# Altium footprint library chipfc_extras_footprint.PCBLIB: 89 footprints (part 2 of 6)
Each footprint in its own frame and in the unit in brackets; x right, y up, seen from the top. Pads: shape width x height; smd on the part's side, far side on the other; paste and mask are expansions set on the pad; w line width, h text height; cw(c..) or ccw(c..) is an arc to the next point about the centre after c.
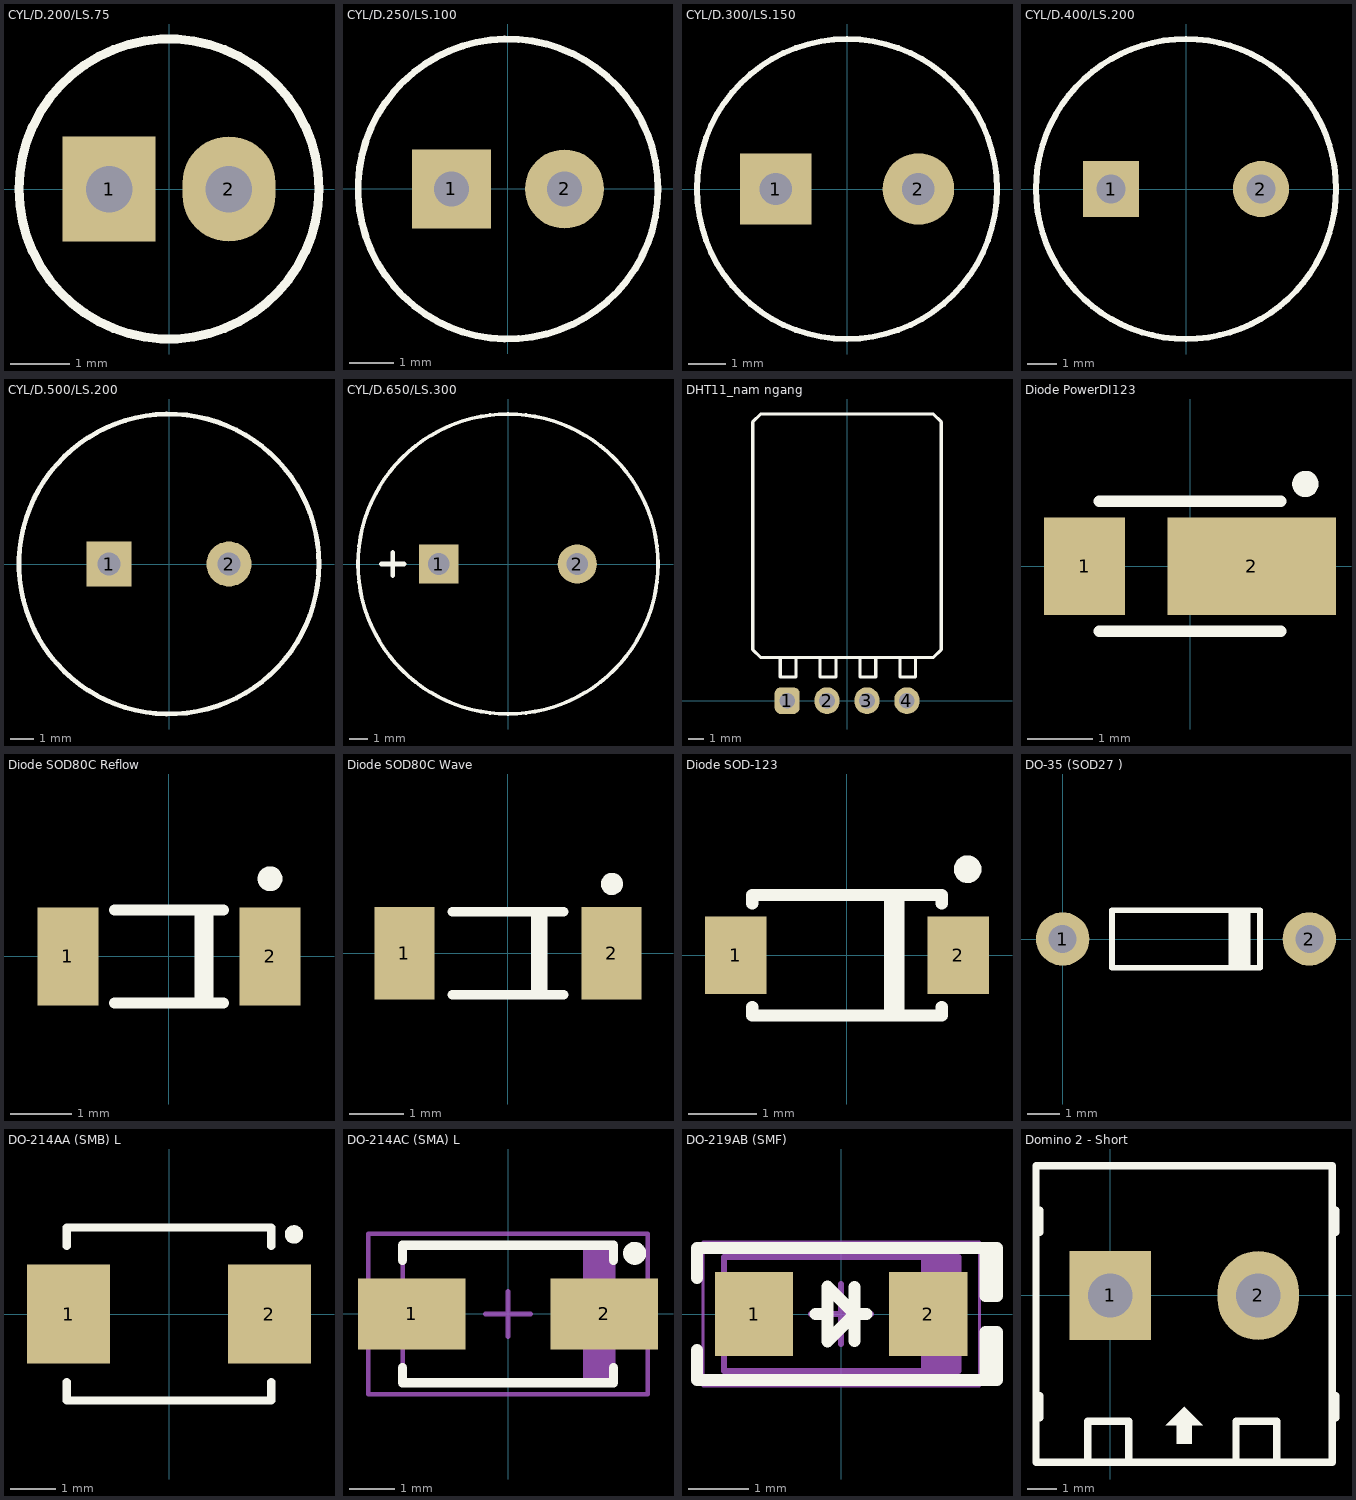
[diagram p1: the footprints below, top view; thin cyan lines are the x and y axes]

## CYL/D.200/LS.75 [mil]
pads (2):
  rect 62x70 hole 31: 1(-40,0)
  oval 62x70 hole 31: 2(40,0)
Top Overlay:
  circle w6: c0,0 r100
3D body "CircuitWorks-ELECTROLITIC CAPACITOR RADIAL 5X11.step": height 433.07, standoff -98.43, extent -98.42,-98.42 98.43,98.43

## CYL/D.250/LS.100 [mil]
pads (2):
  rect 70x70 hole 31: 1(-50,0)
  round 70 hole 31: 2(50,0)
Top Overlay:
  circle w6: c0,0 r132.72
3D body "User Library-CapAluRadial_D63H110.STEP": height 492.13, standoff -118.11, extent -133.86,-133.45 132.72,133.45

## CYL/D.300/LS.150 [mil]
pads (2):
  rect 75x75 hole 34: 1(-75,0)
  round 75 hole 34: 2(75,0)
Top Overlay:
  circle w6: c0,0 r157.49
3D body "CircuitWorks-ELECTROLITIC CAPACITOR RADIAL 8X12.step": height 472.44, standoff -98.43, extent -157.48,-157.48 157.49,157.49

## CYL/D.400/LS.200 [mil]
pads (2):
  rect 75x75 hole 39: 1(-100,0)
  round 75 hole 39: 2(100,0)
Top Overlay:
  lines w8: -200,0 ccw(c0,0) 0,-200 ccw(c0,0) 200,0 ccw(c0,0) 0,200 ccw(c0,0) -200,0
3D body "User Library-CE_R200_D400_H500.step": height 500, standoff -106.3, extent -198.38,-199.3 200,199.32

## CYL/D.500/LS.200 [mil]
pads (2):
  rect 75x75 hole 39: 1(-100,0)
  round 75 hole 39: 2(100,0)
Top Overlay:
  circle w8: c0,0 r250
3D body "User Library-CapAluRadial_D125H200.STEP": height 866.14, standoff -118.11, extent -255.9,-255.12 253.72,255.12

## CYL/D.650/LS.300 [mil]
pads (2):
  rect 85x85 hole 47.24: 1(-150,0)
  round 85 hole 47.24: 2(150,0)
Top Overlay:
  circle w8: c0,0 r325
  lines w10: -275,0 -225,0 ; -250,-25 -250,25
3D body "User Library-CE_R300_D650_H1000.step": height 1000, standoff -137.8, extent -324.13,-324.03 324.8,324.04

## DHT11_nam ngang [mm] "Cam bien do am va nhiet do"
height 5.5
pads (4):
  rrect50% 1.6x1.7 hole 1: 1(-3.81,0)
  oval 1.6x1.7 hole 1: 2(-1.27,0) 3(1.27,0) 4(3.81,0)
Top Overlay:
  lines w0.2: -4.25,2.75 -4.25,1.5 -3.25,1.5 -3.25,2.75 ; -1.71,2.75 -1.71,1.5 -0.71,1.5 -0.71,2.75 ; 0.83,2.75 0.83,1.5 1.83,1.5 1.83,2.75 ; 3.37,2.75 3.37,1.5 4.37,1.5 4.37,2.75 ; -6,3.25 -5.5,2.75 5.5,2.75 6,3.25 6,17.75 5.5,18.25 -5.5,18.25 -6,17.75 -6,3.25
3D body "User Library-DHT11-right.step": height 5.5, standoff -2.6, extent -6,-0.4 6,18.1

## Diode PowerDI123 [mm]
pads (2):
  rect 1.25x1.5 smd: 1(-1.625,0)
  rect 2.6x1.5 smd: 2(0.95,0)
Top Overlay:
  circle w0.203: c1.778,1.27 r0.102
  lines w0.178: -1.397,-1 1.397,-1 ; -1.397,1 1.397,1
3D body "User Library-POWERDI-123.STEP": height 1, standoff 0, extent -1.95,-0.965 1.95,0.965

## Diode SOD80C Reflow [mm]
pads (2):
  rect 1x1.6 smd: 1(-1.65,0) 2(1.65,0)
Top Overlay:
  circle w0.203: c1.651,1.27 r0.102
  lines w0.178: -0.889,-0.762 0.889,-0.762 ; -0.889,0.762 0.889,0.762 ; 0.508,-0.762 0.508,0.762 ; 0.635,-0.762 0.635,0.762
3D body "User Library-sod80-1-mini-melf-LL4148.step": height 1.44, standoff -0.01, extent -1.75,-0.725 1.75,0.725

## Diode SOD80C Wave [mm]
pads (2):
  rect 1.1x1.7 smd: 1(-1.9,0) 2(1.9,0)
Top Overlay:
  circle w0.203: c1.905,1.27 r0.102
  lines w0.178: -1.016,-0.762 1.016,-0.762 ; -1.016,0.762 1.016,0.762 ; 0.508,-0.762 0.508,0.762 ; 0.635,-0.762 0.635,0.762
3D body "User Library-sod80-1-mini-melf-LL4148.step": height 1.44, standoff -0.01, extent -1.75,-0.725 1.75,0.725

## Diode SOD-123 [mm]
pads (2):
  rect 0.91x1.143 smd: 1(-1.64,0) 2(1.64,0)
Top Overlay:
  circle w0.203: c1.778,1.27 r0.102
  lines w0.178: -1.397,-0.762 -1.397,-0.889 1.397,-0.889 1.397,-0.762 ; -1.397,0.762 -1.397,0.889 1.397,0.889 1.397,0.762 ; 0.635,-0.889 0.635,0.889 ; 0.762,-0.889 0.762,0.889
3D body "User Library-SOD-123 CASE 425-04.STEP": height 1.2, standoff 0, extent -1.65,-0.8 1.65,0.8

## DO-35 (SOD27 ) [mil]
pads (2):
  round 65 hole 34: 1(0,0) 2(300,0)
Top Overlay:
  lines w7: 205,-35 205,35 ; 210,-35 210,35 ; 215,-35 215,35 ; 220,-35 220,35 ; 225,-35 225,35 ; 60,-35 240,-35 240,35 60,35 60,-35
3D body "User Library-DO-35.step": height 77.8, standoff -95.83, extent -11.02,-37.79 311.02,37.8

## DO-214AA (SMB) L [mm]
pads (2):
  rect 1.82x2.18 smd: 1(-2.21,0) 2(2.21,0)
Top Overlay:
  circle w0.203: c2.75,1.75 r0.102
  lines w0.178: -2.25,-1.5 -2.25,-1.9 2.25,-1.9 2.25,-1.5 ; -2.25,1.5 -2.25,1.9 2.25,1.9 2.25,1.5
3D body "User Library-DIOM5539X24.step": height 2.45, standoff 0.03, extent -2.75,-1.95 2.75,1.95

## DO-214AC (SMA) L [mm] "Molded Diode, 2-Leads, Body 4.3x2.7mm, IPC Medium Density"
height 2.5
pads (2):
  rect 2.35x1.55 smd: 1(-2.1,0) 2(2.1,0)
Top Overlay:
  circle w0.25: c2.765,1.325 r0.125
  lines w0.2: -2.3,-1.175 -2.3,-1.5 2.3,-1.5 2.3,-1.175 ; -2.3,1.175 -2.3,1.5 2.3,1.5 2.3,1.175
Mechanical 13:
  rectangle: 1.637,-1.45 2.256,1.45
  lines w0.1: -2.3,-1.45 -2.3,1.45 2.3,1.45 2.3,-1.45 -2.3,-1.45
Mechanical 15:
  lines w0.1: -0.5,0 0.5,0 ; 0,-0.5 0,0.5 ; -3.05,-1.75 -3.05,1.75 3.05,1.75 3.05,-1.75 -3.05,-1.75
3D body "User Library-DO-214AC SMA.step": height 2.4, standoff 0, extent -2.6,-1.295 2.6,1.305

## DO-219AB (SMF) [mm] "Molded Diode, 2-Leads, Body 3.90x1.90mm, IPC Medium Density"
height 1.1
pads (2):
  rect 1.3x1.4 smd: 1(-1.45,0) 2(1.45,0)
Top Overlay:
  lines w0.2: -2.4,-0.6 -2.4,-1.1 2.594,-1.1 2.594,-0.3 2.4,-0.3 2.4,-1.1 ; -2.4,0.6 -2.4,1.1 2.594,1.1 2.594,0.3 2.4,0.3 2.4,1.1 ; -0.429,-0.004 -0.229,-0.004 ; 0.225,-0.45 0.225,0.45 ; 0.425,0 0.225,0 ; 0.225,0 -0.229,-0.454 -0.229,0.454 0.225,0
Mechanical 13:
  rectangle: 1.331,-0.95 1.95,0.95
  lines w0.1: -1.95,-0.95 -1.95,0.95 1.95,0.95 1.95,-0.95 -1.95,-0.95
Mechanical 15:
  lines w0.05: -2.3,-1.2 2.3,-1.2 2.3,1.2 -2.3,1.2 -2.3,-1.2
  lines w0.1: -0.5,0 0.5,0 ; 0,-0.5 0,0.5
3D body "Vishay - SMF.step": height 1.18, standoff 0, extent -1.5,-0.898 1.5,0.898

## Domino 2 - Short [mil] "Header 2, 2 pin, hight 400mil, Pin to Pin 200mil, Colour Green"
height 300
pads (2):
  rect 110x120 hole 60: 1(0,0)
  oval 110x120 hole 60: 2(200,0)
Top Overlay:
  region: 100,-150 75,-175 90,-175 90,-200 110,-200 110,-175 125,-175
  lines w10: -95,-165 -95,-135 ; -95,85 -95,115 ; -30,-225 -30,-170 25,-170 25,-225 ; 170,-225 170,-170 225,-170 225,-225 ; 305,-165 305,-135 ; 305,85 305,115 ; -100,-225 -100,175 300,175 300,-225 -100,-225
3D body "2 way std vertical terminal 5.08mm pitch.stp": height 559.05, standoff -137.8, extent -129.17,-217.91 300,167.91